# Altium footprint library Drive_Foc.PcbLib: 29 footprints (part 2 of 2)
Each footprint in its own frame and in the unit in brackets; x right, y up, seen from the top. Pads: shape width x height; smd on the part's side, far side on the other; paste and mask are expansions set on the pad; w line width, h text height; cw(c..) or ccw(c..) is an arc to the next point about the centre after c.
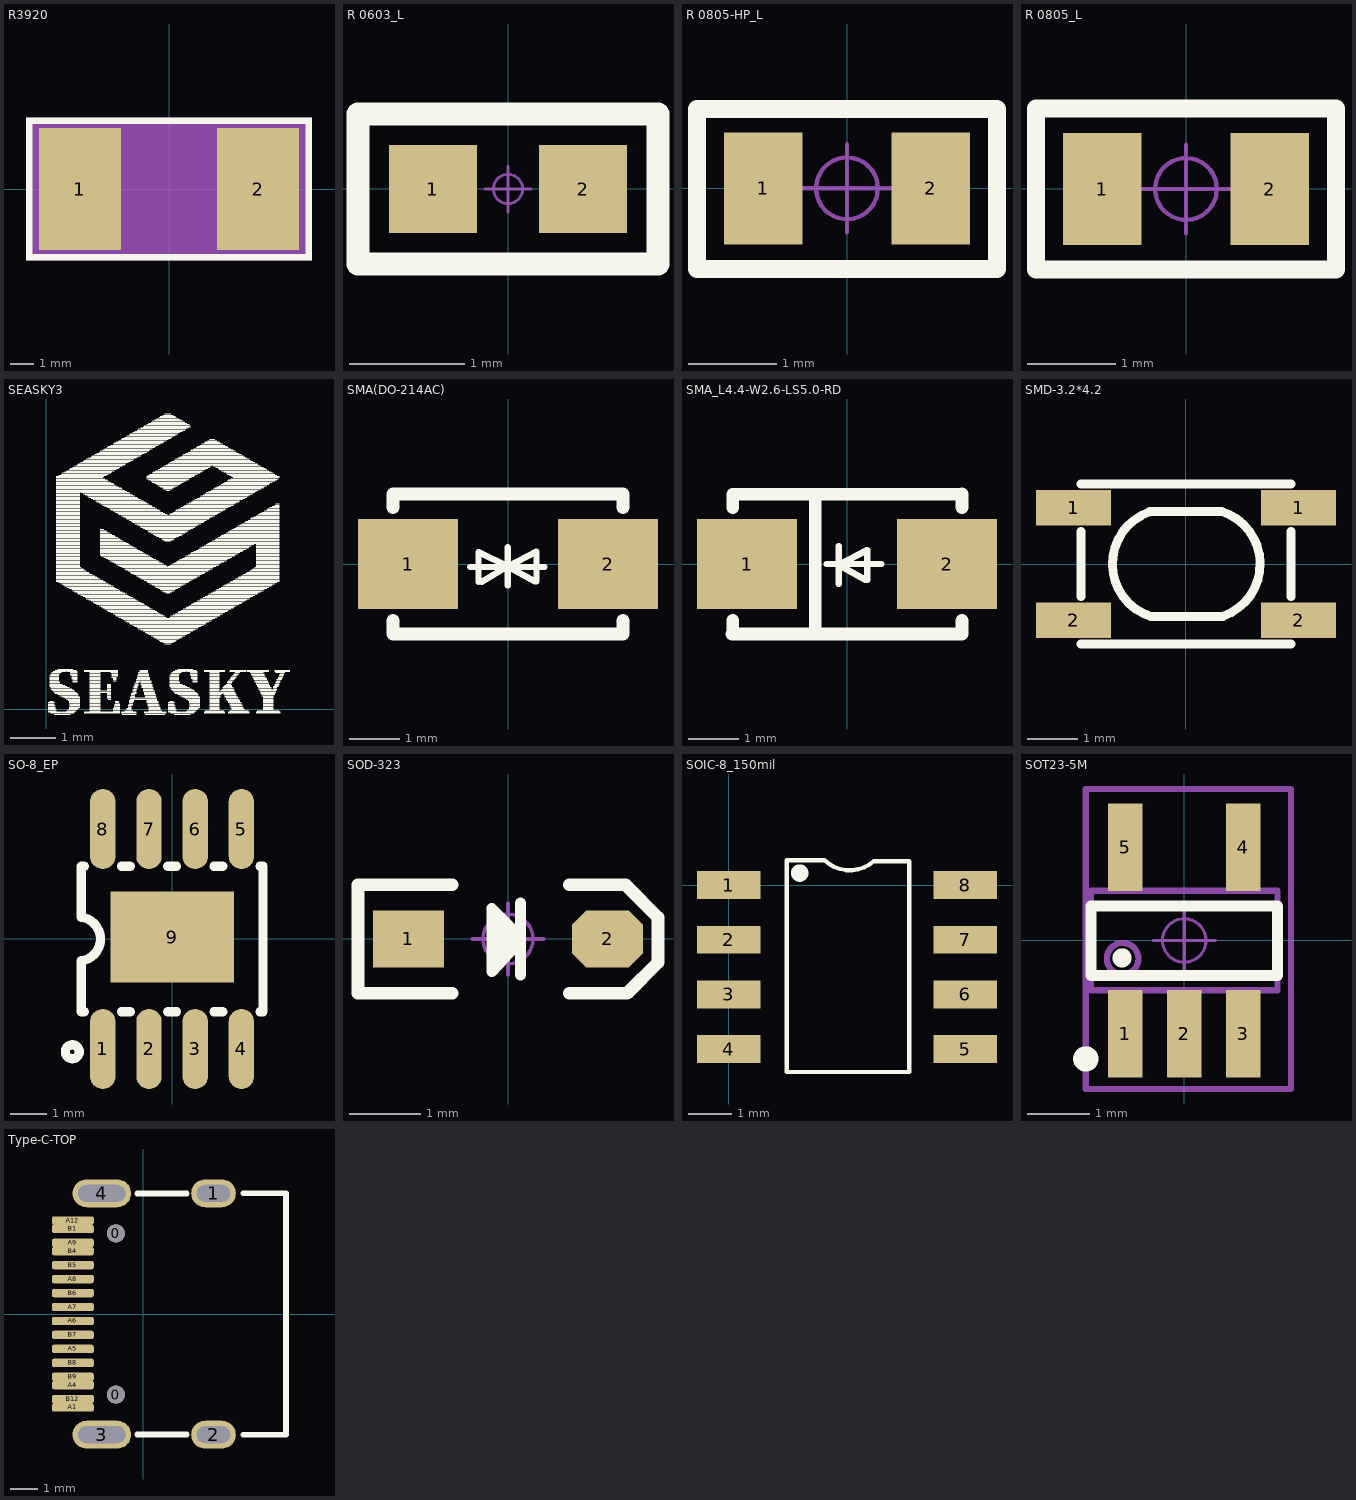
[diagram p1: the footprints below, top view; thin cyan lines are the x and y axes]

## R3920 [mm]
pads (2):
  rect 3.5x5.2 smd: 1(-3.81,0) 2(3.81,0)
Top Overlay:
  region: 5.842,-3.048 -5.842,-3.048 -5.842,-2.794 5.842,-2.794
  region: 6.096,3.048 6.096,-3.048 5.842,-3.048 5.842,2.794
  region: -6.096,3.048 -6.096,-3.048 -5.842,-3.048 -5.842,3.048 6.096,3.048 6.096,2.794 -5.842,2.794 -5.842,3.048
Mechanical 4:
  region: -6.096,3.048 6.096,3.048 6.096,-3.048 -6.096,-3.048
Mechanical 5:
  region: 2.06,2.601 5.56,2.601 5.56,-2.601 2.06,-2.601
  region: -5.56,2.601 -2.06,2.601 -2.06,-2.601 -5.56,-2.601
3D body "MXR3920.step": height 1.39, standoff 0, extent -5.225,-2.525 5.275,2.475

## R 0603_L [mil] "1/10W贴片电阻                 淘宝ID:黄晶宝石"
pads (2):
  rect 30x30 smd: 1(-25.59,0) 2(25.59,0)
Top Overlay:
  lines w8: -51.18,-25.59 51.18,-25.59 51.18,25.59 -51.18,25.59 -51.18,-25.59
Mechanical 15:
  circle w1: c0,0 r5
  lines w1: -7.87,0 7.87,0 ; 0,-7.87 0,7.87
3D body "R 0603.STEP": height 15.79, standoff -0.13, extent -31.49,-15.74 31.5,15.75

## R 0805-HP_L [mm] "1/8W高精度贴片电阻                        淘宝ID:黄晶宝石"
pads (2):
  rect 0.889x1.27 smd: 1(-0.95,0) 2(0.95,0)
Top Overlay:
  lines w0.203: -1.7,-0.914 1.7,-0.914 1.7,0.9 -1.7,0.9 -1.7,-0.914
Mechanical 15:
  circle w0.05: c0,0 r0.35
  lines w0.05: -0.5,0 0.5,0 ; 0,-0.5 0,0.5
3D body "R 0805-HP.STEP": height 0.5, standoff -0.01, extent -1,-0.625 1,0.625

## R 0805_L [mil] "1/8W贴片电阻"
pads (2):
  rect 35x50 smd: 1(-37.4,0) 2(37.4,0)
Top Overlay:
  lines w8: -66.93,-36 66.93,-36 66.93,36 -66.93,36 -66.93,-36
Mechanical 15:
  circle w1.97: c0,0 r13.78
  lines w1.97: -19.68,0 19.68,0 ; 0,-19.68 0,19.68
3D body "R 0805.STEP": height 19.72, standoff -0.24, extent -39.37,-24.6 39.37,24.61

## SEASKY3 [mm]
Top Overlay:
  drawing of 889 lines, arcs and shapes, not listed

## SMA(DO-214AC) [mm]
pads (2):
  rect 2x1.8 smd: 1(-2,0) 2(2,0)
Top Overlay:
  lines w0.127: -0.76,-0.06 0.73,-0.06 ; -0.59,-0.36 -0.59,0.24 -0.002,-0.049 ; -0.53,-0.36 -0.002,-0.049 ; -0.002,-0.43 -0.002,-0.049 ; -0.002,0.332 -0.002,-0.049 ; 0.54,-0.35 -0.002,-0.049 ; 0.57,-0.35 0.57,0.25 -0.002,-0.049
  lines w0.254: -2.3,-1.131 -2.3,-1.4 2.3,-1.4 2.3,-1.131 ; -2.3,1.131 -2.3,1.4 2.3,1.4 2.3,1.131
3D body "SMA.STEP": height 2.15, standoff 0.04, extent -2.533,-1.27 2.563,1.33

## SMA_L4.4-W2.6-LS5.0-RD [mm]
pads (2):
  rect 2x1.8 smd: 1(-2,0) 2(2,0)
Top Overlay:
  lines w0.127: -0.406,0 0.686,0 ; -0.166,-0.401 -0.166,-0.02 ; -0.166,0.361 -0.166,-0.02 ; 0.376,-0.321 -0.166,-0.02 ; 0.406,-0.321 0.406,0.279 -0.166,-0.02
  lines w0.254: -2.3,-1.4 2.3,-1.4 2.3,-1.131 ; -2.286,-1.4 -2.286,-1.131 ; -2.286,1.131 -2.286,1.397 2.3,1.397 ; -0.635,-1.4 -0.635,1.397 ; 2.3,1.131 2.3,1.4
3D body "SMA.STEP": height 2.15, standoff 0.04, extent -2.533,-1.27 2.563,1.33

## SMD-3.2*4.2 [mm]
pads (4):
  rect 1.5x0.7 smd: 1(-2.25,1.125) 1(2.25,1.125) 2(-2.25,-1.125) 2(2.25,-1.125)
Top Overlay:
  lines w0.178: -2.1,-1.6 2.1,-1.6 ; -2.1,-0.65 -2.1,0.65 ; -2.1,1.6 2.1,1.6 ; -0.738,1.037 ccw(c-0.372,0) -0.7,-1.05 0.737,-1.05 ; -0.725,1.05 0.712,1.05 cw(c0.384,0) 0.75,-1.037 ; 2.1,-0.65 2.1,0.65
3D body: height 1.8, standoff 0.13, extent -1.306,-1.092 1.424,1.003
3D body: height 1.5, standoff 0.05, extent -2.1,-1.6 2.091,1.575
3D body: height 0.13, standoff 0, extent -2.735,0.94 2.472,1.321
3D body: height 0.13, standoff 0, extent -2.735,-1.282 2.472,-0.901

## SO-8_EP [mm]
pads (9):
  oval 0.7x2.2 smd: 1(-1.905,-3.023) 2(-0.635,-3.023) 3(0.635,-3.023) 4(1.905,-3.023) 5(1.905,3.023) 6(0.635,3.023) 7(-0.635,3.023) 8(-1.905,3.023)
  rect 3.4x2.5 smd: 9(0,0.051)
Top Overlay:
  circle w0.254: c-2.743,-3.099 r0.191
  lines w0.254: -2.418,-2 -2.5,-2 -2.5,-0.6 ccw(c-2.572,0) -2.499,0.599 -2.5,2 -2.418,2 ; -1.392,-2 -1.148,-2 ; -1.392,2 -1.148,2 ; -0.122,-2 0.122,-2 ; -0.122,2 0.122,2 ; 1.148,-2 1.392,-2 ; 1.148,2 1.392,2 ; 2.418,-2 2.5,-2 2.5,2 2.418,2
3D body "SOP8.STEP": height 1.9, standoff 0, extent -2.5,-2.92 2.5,3.086

## SOD-323 [mm] "1.8x1.3X0.9mm（长宽高，不包括引脚）"
pads (2):
  rect 1x0.8 smd: 1(-1.4,0)
  oct 1x0.8 smd: 2(1.4,0)
Top Overlay:
  lines w0.152: 0.178,-0.508 0.178,0.508 ; 0.178,-0.025 -0.229,-0.457 -0.229,0.432 0.178,0.025
  lines w0.178: -0.787,-0.762 -2.108,-0.762 -2.108,0.762 -0.787,0.762 ; 0.864,-0.762 1.676,-0.762 2.108,-0.33 2.108,0.305 1.651,0.762 0.864,0.762
  lines w0.254: -0.127,0.254 -0.152,-0.178 0.025,-0.025 -0.025,0.127
Mechanical 15:
  circle w0.05: c0,0 r0.35
  lines w0.05: -0.5,0 0.5,0 ; 0,-0.5 0,0.5
3D body "SOD-323.STEP": height 1, standoff 0.04, extent -1.337,-0.631 1.311,0.669

## SOIC-8_150mil [mm]
pads (8):
  rect 1.473x0.65 smd: 1(0,0) 2(0,-1.27) 3(0,-2.54) 4(0,-3.81) 5(5.5,-3.81) 6(5.5,-2.54) 7(5.5,-1.27) 8(5.5,0)
Top Overlay:
  circle w0.305: c1.65,0.28 r0.05
  lines w0.1: 2.2,0.58 1.35,0.58 1.35,-4.345 4.2,-4.345 4.2,0.555 3.4,0.555 ; 2.225,0.58 ccw(c2.812,1.193) 3.374,0.557
3D body "SO-8.STEP": height 1.7, standoff 0, extent -0.3,-4.345 5.7,0.555

## SOT23-5M [mm] "3x1.6x1.1mm(长宽高) 封装库来自淘宝卖家 ID：黄晶宝石"
pads (5):
  rect 0.55x1.4 smd: 1(-0.95,-1.5) 2(0,-1.5) 3(0.95,-1.5) 4(0.95,1.5) 5(-0.95,1.5)
Top Overlay:
  circle w0.254: c-1.585,-1.905 r0.076
  circle w0.254: c-1.001,-0.281 r0.025
  lines w0.178: -1.5,-0.56 1.5,-0.56 1.5,0.557 -1.5,0.557 -1.5,-0.56
Mechanical 13:
  circle w0.1: c-0.992,-0.292 r0.254
  lines w0.1: -1.5,-0.8 -1.5,0.8 1.5,0.8 1.5,-0.8 -1.5,-0.8
Mechanical 15:
  circle w0.05: c0,0 r0.35
  lines w0.05: -0.5,0 0.5,0 ; 0,-0.5 0,0.5
  lines w0.1: -1.585,-2.389 -1.585,2.437 1.717,2.437 1.717,-2.389 -1.585,-2.389
3D body "SOT23-5.STEP": height 1.15, standoff -0.03, extent -1.5,-1.403 1.5,1.403

## Type-C-TOP [mm]
height 0.8
pads (22):
  round 0.65 hole 0.65: 0(-0.98,-2.89) 0(-0.98,2.89)
  oval 1.6x1 hole 0.6 slot 1.2 at 0 deg: 1(2.52,4.325) 2(2.52,-4.325)
  oval 2.1x1 hole 0.6 slot 1.7 at 0 deg: 3(-1.48,-4.325) 4(-1.48,4.325)
  rrect50% 1.5x0.3 smd: A1(-2.52,-3.35) A4(-2.52,-2.55) A5(-2.52,-1.25) A6(-2.52,-0.25) A7(-2.52,0.25) A8(-2.52,1.25) A9(-2.52,2.55) A12(-2.52,3.35) B1(-2.52,3.05) B4(-2.52,2.25) B5(-2.52,1.75) B6(-2.52,0.75) B7(-2.52,-0.75) B8(-2.52,-1.75) B9(-2.52,-2.25) B12(-2.52,-3.05)
Top Overlay:
  lines w0.203: -0.218,-4.318 1.56,-4.318 ; -0.218,4.318 1.559,4.318 ; 3.591,-4.325 5.12,-4.325 5.12,4.325 3.591,4.325
3D body "User Library-1054500101.STEP": height 3.28, standoff -0.68, extent -2.645,-4.476 5.255,4.464